# Altium footprint library ParsaLibrary.PcbLib: 526 footprints (part 18 of 33)
Each footprint in its own frame and in the unit in brackets; x right, y up, seen from the top. Pads: shape width x height; smd on the part's side, far side on the other; paste and mask are expansions set on the pad; w line width, h text height; cw(c..) or ccw(c..) is an arc to the next point about the centre after c.
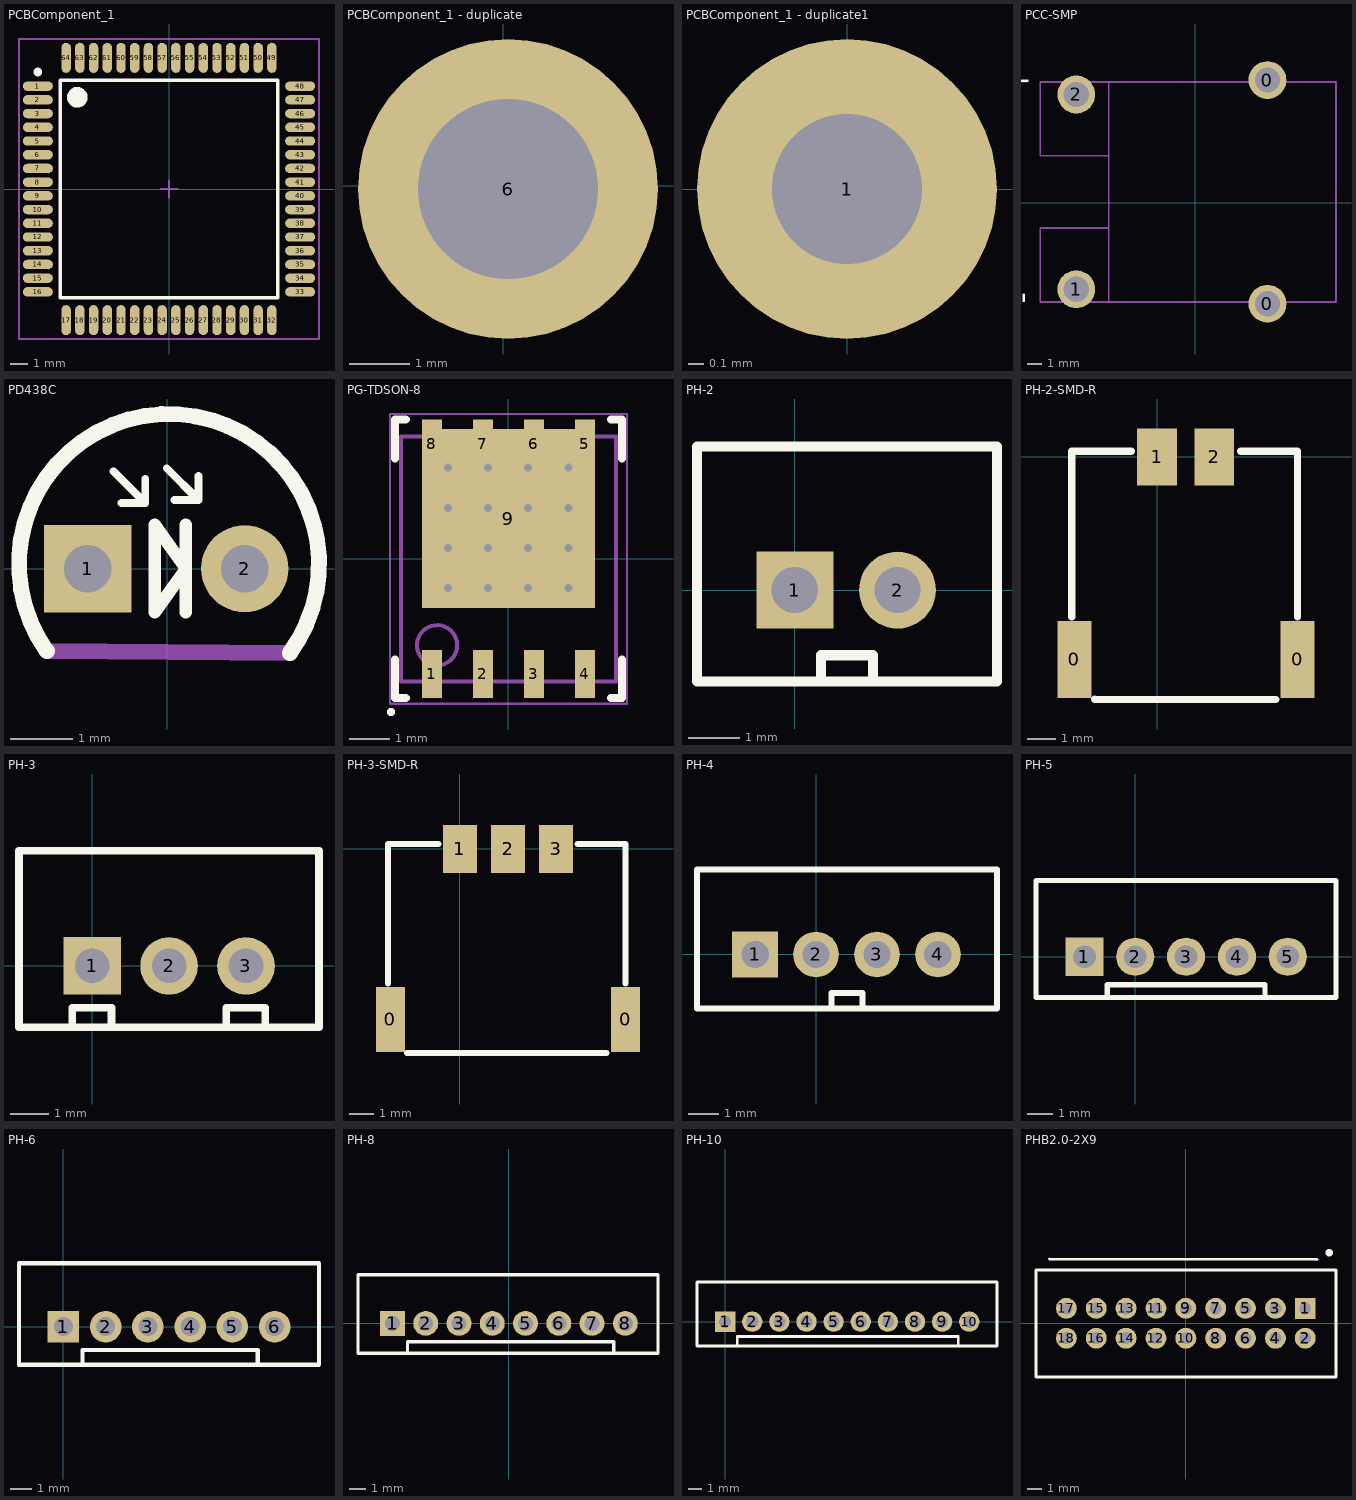
[diagram p17: the footprints below, top view; thin cyan lines are the x and y axes]

## PCBComponent_1 [mm]
pads (64):
  oval 1.75x0.55 smd: 1(-7.65,6) 2(-7.65,5.2) 3(-7.65,4.4) 4(-7.65,3.6) 5(-7.65,2.8) 6(-7.65,2) 7(-7.65,1.2) 8(-7.65,0.4) 9(-7.65,-0.4) 10(-7.65,-1.2) 11(-7.65,-2) 12(-7.65,-2.8) 13(-7.65,-3.6) 14(-7.65,-4.4) 15(-7.65,-5.2) 16(-7.65,-6) 33(7.65,-6) 34(7.65,-5.2) 35(7.65,-4.4) 36(7.65,-3.6) 37(7.65,-2.8) 38(7.65,-2) 39(7.65,-1.2) 40(7.65,-0.4) 41(7.65,0.4) 42(7.65,1.2) 43(7.65,2) 44(7.65,2.8) 45(7.65,3.6) 46(7.65,4.4) 47(7.65,5.2) 48(7.65,6)
  oval 0.55x1.75 smd: 17(-6,-7.65) 18(-5.2,-7.65) 19(-4.4,-7.65) 20(-3.6,-7.65) 21(-2.8,-7.65) 22(-2,-7.65) 23(-1.2,-7.65) 24(-0.4,-7.65) 25(0.4,-7.65) 26(1.2,-7.65) 27(2,-7.65) 28(2.8,-7.65) 29(3.6,-7.65) 30(4.4,-7.65) 31(5.2,-7.65) 32(6,-7.65) 49(6,7.65) 50(5.2,7.65) 51(4.4,7.65) 52(3.6,7.65) 53(2.8,7.65) 54(2,7.65) 55(1.2,7.65) 56(0.4,7.65) 57(-0.4,7.65) 58(-1.2,7.65) 59(-2,7.65) 60(-2.8,7.65) 61(-3.6,7.65) 62(-4.4,7.65) 63(-5.2,7.65) 64(-6,7.65)
Top Overlay:
  circle w0.6: c-5.35,5.35 r0.3
  circle w0.25: c-7.65,6.825 r0.125
  lines w0.2: -6.35,-6.35 6.35,-6.35 6.35,6.35 -6.35,6.35 -6.35,-6.35
Mechanical 15:
  lines w0.1: -0.5,0 0.5,0 ; 0,-0.5 0,0.5 ; -8.75,-8.75 8.75,-8.75 8.75,8.75 -8.75,8.75 -8.75,-8.75
3D body "User Library-atmega64 (tqfp64).step": height 1.1, standoff -0.01, extent -8,-8 8,8

## PCBComponent_1 - duplicate [mm]
pads (1):
  round 5 hole 3: 6(0.076,-0.051)

## PCBComponent_1 - duplicate1 [mm]
pads (1):
  round 2 hole 1: 1(0,0)
3D body "User Library-User Library-EE55-H.step": height 50.03, standoff -4.2, extent -3.2,-3.365 52.63,51.765

## PCC-SMP [mil]
pads (4):
  round 105 hole 70: 0(200.79,-279.53) 0(200.79,340.47) 1(-329.21,-239.53) 2(-329.21,300.47)
Top Overlay:
  text "-" at -429.21,-279.53 h108.5
  text "+" at -440.94,300.47 h108.5
Mechanical 3:
  lines w5: -239.21,-274.53 -239.21,-69.53 ; -239.21,335.47 -239.21,130.47 ; -239.21,-69.53 -239.21,130.47 ; -239.21,-69.53 -429.21,-69.53 -429.21,-274.53 390.79,-274.53 390.79,335.47 -429.21,335.47 -429.21,130.47 -239.21,130.47
3D body "User Library-minitc-pcc-smp.step": height 387.72, standoff -135.83, extent -429.21,-281.5 389.68,336.62

## PD438C [mil]
pads (2):
  rect 55x55 hole 30: 1(-50,0)
  round 55 hole 30: 2(48.82,0.11)
Top Overlay:
  lines w5: -33.87,61.43 -13.87,41.43 ; -28.87,41.43 -13.87,41.43 ; -13.87,56.43 -13.87,41.43 ; -0.32,63.31 19.68,43.31 ; 4.68,43.31 19.68,43.31 ; 19.68,58.31 19.68,43.31
  lines w7.87: 11.79,-27.45 11.79,27.66 ; -7.9,-27.45 11.79,0.11 -7.9,27.66 -7.9,-27.45
  lines w10: -75.81,-51.9 cw(c1.09,3.01) 77.22,-52.96
Mechanical 8:
  lines w10: -75.81,-51.9 77.22,-52.96

## PG-TDSON-8 [mm] "SON, 8-Leads, Body 5.07x5.90mm, Pitch 1.27mm, Thermal Pad 4.15x3.87mm, IPC Medium Density"
height 1.2
pads (9):
  rect 0.5x1.2 smd: 1(-1.905,-2.863) 2(-0.635,-2.863) 3(0.635,-2.863) 4(1.905,-2.863) 5(1.905,2.863) 6(0.635,2.863) 7(-0.635,2.863) 8(-1.905,2.863)
  rect 4.3x4.455 smd paste-1.935: 9(0,1)
via 1.492,2.27 diameter 0.5 hole 0.2
via 1.492,1.27 diameter 0.5 hole 0.2
via 1.492,0.27 diameter 0.5 hole 0.2
via 1.492,-0.73 diameter 0.5 hole 0.2
via 0.492,2.27 diameter 0.5 hole 0.2
via 0.492,1.27 diameter 0.5 hole 0.2
via 0.492,0.27 diameter 0.5 hole 0.2
via 0.492,-0.73 diameter 0.5 hole 0.2
via -0.508,2.27 diameter 0.5 hole 0.2
via -0.508,1.27 diameter 0.5 hole 0.2
via -0.508,0.27 diameter 0.5 hole 0.2
via -0.508,-0.73 diameter 0.5 hole 0.2
via -1.508,2.27 diameter 0.5 hole 0.2
via -1.508,1.27 diameter 0.5 hole 0.2
via -1.508,0.27 diameter 0.5 hole 0.2
via -1.508,-0.73 diameter 0.5 hole 0.2
Top Overlay:
  circle w0.1: c-2.921,-3.81 r0.05
  lines w0.2: -2.825,-2.5 -2.825,-3.465 -2.555,-3.465 ; -2.825,2.5 -2.825,3.465 -2.555,3.465 ; 2.555,-3.465 2.825,-3.465 2.825,-2.5 ; 2.555,3.465 2.825,3.465 2.825,2.5
Mechanical 13:
  circle w0.1: c-1.775,-2.15 r0.5
  lines w0.1: -2.675,-3.05 -2.675,3.05 2.675,3.05 2.675,-3.05 -2.675,-3.05
Mechanical 15:
  lines w0.05: -2.95,-3.605 -2.95,3.605 2.95,3.605 2.95,-3.605 -2.95,-3.605
  lines w0.1: -0.508,0.77 0.492,0.77 ; -0.008,0.27 -0.008,1.27
3D body "PG-TDSON-8.step": height 1.2, standoff 0, extent -2.675,-3.4 2.675,3.4

## PH-2 [mm]
pads (2):
  rect 1.5x1.5 hole 0.9: 1(0,0)
  round 1.5 hole 0.9: 2(2,0)
Top Overlay:
  lines w0.2: 0.508,-1.778 0.508,-1.27 1.524,-1.27 1.524,-1.778 ; -1.905,-1.778 3.937,-1.778 3.937,2.794 -1.905,2.794 -1.905,-1.778
3D body "User Library-b2b-ph-ks-1.step": height 6, standoff -3, extent -1.963,-1.742 3.937,2.758

## PH-2-SMD-R [mm]
pads (4):
  rect 1.2x2.7 smd: 0(-2.9,-7.1) 0(4.92,-7.1)
  rect 1.4x2 smd: 1(0,0) 2(2,0)
Top Overlay:
  lines w0.254: -3,-5.6 -3,0.2 -0.9,0.2 ; -2.2,-8.5 4.164,-8.507 ; 2.92,0.2 4.92,0.2 4.92,-5.6
3D body "S2B-PH-SM4-TB.stp": height 4.8, standoff 0, extent -2.951,-8.4 4.949,0.2

## PH-3 [mm]
pads (3):
  rect 1.5x1.5 hole 0.9: 1(0,0)
  round 1.5 hole 0.9: 2(2,0) 3(4,0)
Top Overlay:
  lines w0.2: -0.516,-1.6 -0.516,-1.092 0.5,-1.092 0.5,-1.6 ; 3.484,-1.6 3.484,-1.092 4.5,-1.092 4.5,-1.6 ; -1.905,-1.6 5.9,-1.6 5.9,3 -1.905,3 -1.905,-1.6
3D body "User Library-PH2.0-3P.STEP": height 6, standoff -3.44, extent -2,-1.7 6,3.1

## PH-3-SMD-R [mm]
pads (5):
  rect 1.2x2.7 smd: 0(-2.9,-7.1) 0(6.9,-7.1)
  rect 1.4x2 smd: 1(0,0) 2(2,0) 3(4,0)
Top Overlay:
  lines w0.254: -3,-5.6 -3,0.2 -0.9,0.2 ; -2.2,-8.5 6.1,-8.5 ; 4.9,0.2 6.9,0.2 6.9,-5.6
3D body "S3B-PH-SM4-TB.stp": height 4.8, standoff 0, extent -2.95,-8.5 6.95,0.1

## PH-4 [mm]
pads (4):
  rect 1.5x1.5 hole 0.9: 1(-2,0)
  round 1.5 hole 0.9: 2(0,0) 3(2,0) 4(4,0)
Top Overlay:
  lines w0.2: 0.508,-1.778 0.508,-1.27 1.524,-1.27 1.524,-1.778 ; -3.905,-1.778 -3.905,2.794 5.937,2.794 5.937,-1.778 -3.905,-1.778
3D body "User Library-b4b-ph-k-s.step": height 6, standoff -3, extent -3.95,-1.75 5.95,2.75

## PH-5 [mm]
pads (5):
  rect 1.5x1.5 hole 0.9: 1(-2,0)
  round 1.5 hole 0.9: 2(0,0) 3(2,0) 4(4,0) 5(6,0)
Top Overlay:
  lines w0.2: -1.1,-1.6 -1.1,-1.1 5.1,-1.1 5.1,-1.6 ; -3.905,-1.6 7.9,-1.6 7.9,3 -3.905,3 -3.905,-1.6
3D body "User Library-PH2_0-5P.X_B": height 6, standoff -3.44, extent -4,-1.7 8,3.1

## PH-6 [mm]
pads (6):
  rect 1.5x1.5 hole 0.9: 1(0,0)
  round 1.5 hole 0.9: 2(2,0) 3(4,0) 4(6,0) 5(8,0) 6(10,0)
Top Overlay:
  lines w0.2: 0.9,-1.8 0.9,-1.1 9.2,-1.1 9.2,-1.8 ; -2.1,-1.8 -2.1,3 12.1,3 12.1,-1.8 -2.1,-1.8
3D body "User Library-b6b-ph-ks.step": height 6, standoff -3, extent -1.95,-1.65 11.95,2.85

## PH-8 [mm]
pads (8):
  rect 1.5x1.5 hole 0.9: 1(-7,0)
  round 1.5 hole 0.9: 2(-5,0) 3(-3,0) 4(-1,0) 5(1,0) 6(3,0) 7(5,0) 8(7,0)
Top Overlay:
  lines w0.2: -6.1,-1.8 -6.1,-1.1 6.299,-1.1 6.299,-1.8 ; -9.075,-1.8 8.966,-1.8 8.966,2.928 -9.075,2.928 -9.075,-1.8
3D body "User Library-JST PH (1).step": height 6, standoff -3, extent -8.95,-1.717 8.95,2.783

## PH-10 [mm]
pads (10):
  rect 1.5x1.5 hole 0.9: 1(0,0)
  round 1.5 hole 0.9: 2(2,0) 3(4,0) 4(6,0) 5(8,0) 6(10,0) 7(12,0) 8(14,0) 9(16,0) 10(18,0)
Top Overlay:
  lines w0.2: 0.9,-1.8 0.9,-1.1 17.2,-1.1 17.2,-1.8 ; -2.075,-1.8 -2.075,2.928 20.05,2.928 20.05,-1.8 -2.075,-1.8
3D body "User Library-b10b-ph-ks.step": height 6, standoff -3, extent -1.963,-1.683 19.937,2.817

## PHB2.0-2X9 [mm]
pads (18):
  rect 1.4x1.4 hole 0.8: 1(8,1)
  round 1.4 hole 0.8: 2(8,-1) 3(6,1) 4(6,-1) 5(4,1) 6(4,-1) 7(2,1) 8(2,-1) 9(0,1) 10(0,-1) 11(-2,1) 12(-2,-1) 13(-4,1) 14(-4,-1) 15(-6,1) 16(-6,-1) 17(-8,1) 18(-8,-1)
Top Overlay:
  circle w0.25: c9.601,4.724 r0.125
  lines w0.2: -9.119,4.293 8.788,4.267 ; -10.033,-3.607 -10.033,3.581 10.058,3.581 10.058,-3.607 -10.033,-3.607
3D body "User Library-phb-2x9-1.STEP": height 7.7, standoff -3, extent -10,-3.65 10,4.35